# Altium footprint library LCLP.PcbLib: 75 footprints (part 4 of 5)
Each footprint in its own frame and in the unit in brackets; x right, y up, seen from the top. Pads: shape width x height; smd on the part's side, far side on the other; paste and mask are expansions set on the pad; w line width, h text height; cw(c..) or ccw(c..) is an arc to the next point about the centre after c.
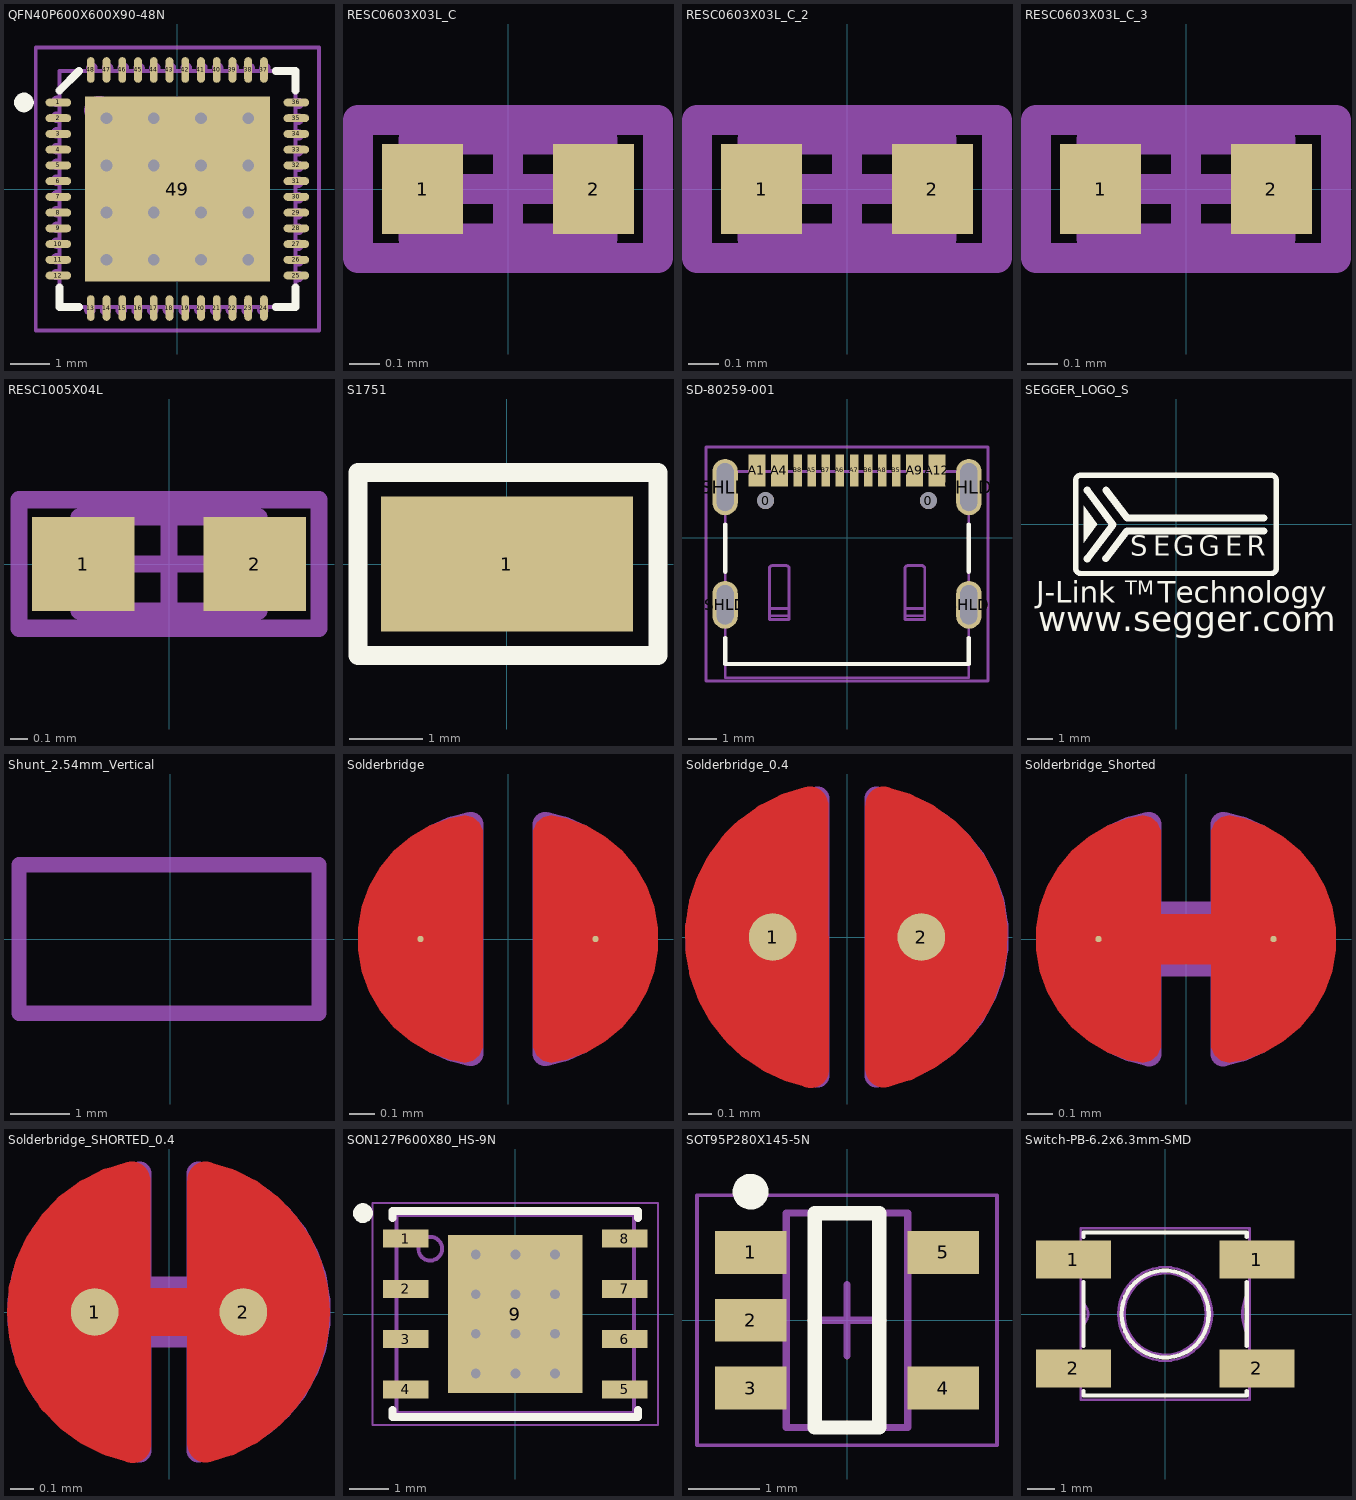
[diagram p3: the footprints below, top view; thin cyan lines are the x and y axes]

## QFN40P600X600X90-48N [mm] "QFN, 48-Leads, Body 6,0x6,0mm (max), Pitch 0,40mm, IPC Medium Density"
height 0.9
pads (49):
  oval 0.65x0.2 smd mask+0.05: 1(-3.025,2.2) 2(-3.025,1.8) 3(-3.025,1.4) 4(-3.025,1) 5(-3.025,0.6) 6(-3.025,0.2) 7(-3.025,-0.2) 8(-3.025,-0.6) 9(-3.025,-1) 10(-3.025,-1.4) 11(-3.025,-1.8) 12(-3.025,-2.2) 25(3.025,-2.2) 26(3.025,-1.8) 27(3.025,-1.4) 28(3.025,-1) 29(3.025,-0.6) 30(3.025,-0.2) 31(3.025,0.2) 32(3.025,0.6) 33(3.025,1) 34(3.025,1.4) 35(3.025,1.8) 36(3.025,2.2)
  oval 0.2x0.65 smd mask+0.05: 13(-2.2,-3.025) 14(-1.8,-3.025) 15(-1.4,-3.025) 16(-1,-3.025) 17(-0.6,-3.025) 18(-0.2,-3.025) 19(0.2,-3.025) 20(0.6,-3.025) 21(1,-3.025) 22(1.4,-3.025) 23(1.8,-3.025) 24(2.2,-3.025) 37(2.2,3.025) 38(1.8,3.025) 39(1.4,3.025) 40(1,3.025) 41(0.6,3.025) 42(0.2,3.025) 43(-0.2,3.025) 44(-0.6,3.025) 45(-1,3.025) 46(-1.4,3.025) 47(-1.8,3.025) 48(-2.2,3.025)
  rect 4.7x4.7 smd: 49(0,0)
via 1.8,-1.8 diameter 0.5 hole 0.3
via 0.6,-1.8 diameter 0.5 hole 0.3
via -0.6,-1.8 diameter 0.5 hole 0.3
via -1.8,-1.8 diameter 0.5 hole 0.3
via 1.8,-0.6 diameter 0.5 hole 0.3
via 0.6,-0.6 diameter 0.5 hole 0.3
via -0.6,-0.6 diameter 0.5 hole 0.3
via -1.8,-0.6 diameter 0.5 hole 0.3
via 1.8,0.6 diameter 0.5 hole 0.3
via 0.6,0.6 diameter 0.5 hole 0.3
via -0.6,0.6 diameter 0.5 hole 0.3
via -1.8,0.6 diameter 0.5 hole 0.3
via 1.8,1.8 diameter 0.5 hole 0.3
via 0.6,1.8 diameter 0.5 hole 0.3
via -0.6,1.8 diameter 0.5 hole 0.3
via -1.8,1.8 diameter 0.5 hole 0.3
Top Overlay:
  circle w0.25: c-3.9,2.2 r0.125
  lines w0.2: -3,-2.5 -3,-3 -2.5,-3 ; -3,2.5 -2.5,3 ; 2.5,-3 3,-3 3,-2.5 ; 2.5,3 3,3 3,2.5
Mechanical 7:
  circle w0.1: c-2,2 r0.32
  lines w0.1: -3,-2.269 -3.071,-2.269 cw(c-3.071,-2.174) -3.071,-2.079 -3,-2.079 ; -3,-1.869 -3.071,-1.869 cw(c-3.071,-1.774) -3.071,-1.679 -3,-1.679 ; -3,-1.469 -3.071,-1.469 cw(c-3.071,-1.374) -3.071,-1.279 -3,-1.279 ; -3,-1.069 -3.071,-1.069 cw(c-3.071,-0.974) -3.071,-0.879 -3,-0.879 ; -3,-0.669 -3.071,-0.669 cw(c-3.071,-0.574) -3.071,-0.479 -3,-0.479 ; -3,-0.269 -3.071,-0.269 cw(c-3.071,-0.174) -3.071,-0.079 -3,-0.079 ; -3,0.131 -3.071,0.131 cw(c-3.071,0.226) -3.071,0.321 -3,0.321 ; -3,0.531 -3.071,0.531 cw(c-3.071,0.626) -3.071,0.721 -3,0.721 ; -3,0.931 -3.071,0.931 cw(c-3.071,1.026) -3.071,1.121 -3,1.121 ; -3,1.331 -3.071,1.331 cw(c-3.071,1.426) -3.071,1.521 -3,1.521 ; -3,1.731 -3.071,1.731 cw(c-3.071,1.826) -3.071,1.921 -3,1.921 ; -3,2.131 -3.071,2.131 cw(c-3.071,2.226) -3.071,2.321 -3,2.321 ; -2.321,-3 -2.321,-3.071 ccw(c-2.226,-3.071) -2.131,-3.071 -2.131,-3 ; -2.269,3 -2.269,3.071 cw(c-2.174,3.071) -2.079,3.071 -2.079,3 ; -1.921,-3 -1.921,-3.071 ccw(c-1.826,-3.071) -1.731,-3.071 -1.731,-3 ; -1.869,3 -1.869,3.071 cw(c-1.774,3.071) -1.679,3.071 -1.679,3 ; -1.521,-3 -1.521,-3.071 ccw(c-1.426,-3.071) -1.331,-3.071 -1.331,-3 ; -1.469,3 -1.469,3.071 cw(c-1.374,3.071) -1.279,3.071 -1.279,3 ; -1.121,-3 -1.121,-3.071 ccw(c-1.026,-3.071) -0.931,-3.071 -0.931,-3 ; -1.069,3 -1.069,3.071 cw(c-0.974,3.071) -0.879,3.071 -0.879,3 ; -0.721,-3 -0.721,-3.071 ccw(c-0.626,-3.071) -0.531,-3.071 -0.531,-3 ; -0.669,3 -0.669,3.071 cw(c-0.574,3.071) -0.479,3.071 -0.479,3 ; -0.321,-3 -0.321,-3.071 ccw(c-0.226,-3.071) -0.131,-3.071 -0.131,-3 ; -0.269,3 -0.269,3.071 cw(c-0.174,3.071) -0.079,3.071 -0.079,3 ; 0.079,-3 0.079,-3.071 ccw(c0.174,-3.071) 0.269,-3.071 0.269,-3 ; 0.131,3 0.131,3.071 cw(c0.226,3.071) 0.321,3.071 0.321,3 ; 0.479,-3 0.479,-3.071 ccw(c0.574,-3.071) 0.669,-3.071 0.669,-3 ; 0.531,3 0.531,3.071 cw(c0.626,3.071) 0.721,3.071 0.721,3 ; 0.879,-3 0.879,-3.071 ccw(c0.974,-3.071) 1.069,-3.071 1.069,-3 ; 0.931,3 0.931,3.071 cw(c1.026,3.071) 1.121,3.071 1.121,3 ; 1.279,-3 1.279,-3.071 ccw(c1.374,-3.071) 1.469,-3.071 1.469,-3 ; 1.331,3 1.331,3.071 cw(c1.426,3.071) 1.521,3.071 1.521,3 ; 1.679,-3 1.679,-3.071 ccw(c1.774,-3.071) 1.869,-3.071 1.869,-3 ; 1.731,3 1.731,3.071 cw(c1.826,3.071) 1.921,3.071 1.921,3 ; 2.079,-3 2.079,-3.071 ccw(c2.174,-3.071) 2.269,-3.071 2.269,-3 ; 2.131,3 2.131,3.071 cw(c2.226,3.071) 2.321,3.071 2.321,3 ; 3,-2.321 3.071,-2.321 ccw(c3.071,-2.226) 3.071,-2.131 3,-2.131 ; 3,-1.921 3.071,-1.921 ccw(c3.071,-1.826) 3.071,-1.731 3,-1.731 ; 3,-1.521 3.071,-1.521 ccw(c3.071,-1.426) 3.071,-1.331 3,-1.331 ; 3,-1.121 3.071,-1.121 ccw(c3.071,-1.026) 3.071,-0.931 3,-0.931 ; 3,-0.721 3.071,-0.721 ccw(c3.071,-0.626) 3.071,-0.531 3,-0.531 ; 3,-0.321 3.071,-0.321 ccw(c3.071,-0.226) 3.071,-0.131 3,-0.131 ; 3,0.079 3.071,0.079 ccw(c3.071,0.174) 3.071,0.269 3,0.269 ; 3,0.479 3.071,0.479 ccw(c3.071,0.574) 3.071,0.669 3,0.669 ; 3,0.879 3.071,0.879 ccw(c3.071,0.974) 3.071,1.069 3,1.069 ; 3,1.279 3.071,1.279 ccw(c3.071,1.374) 3.071,1.469 3,1.469 ; 3,1.679 3.071,1.679 ccw(c3.071,1.774) 3.071,1.869 3,1.869 ; 3,2.079 3.071,2.079 ccw(c3.071,2.174) 3.071,2.269 3,2.269 ; -3,-3 3,-3 3,3 -3,3 -3,-3
  text ".Designator" at -0.079,-0.174 h0.31
Mechanical 15:
  lines w0.1: -0.5,0 0.5,0 ; 0,-0.5 0,0.5 ; -3.6,-3.6 3.6,-3.6 3.6,3.6 -3.6,3.6 -3.6,-3.6
3D body "User Library-QFN48.step": height 0.86, standoff -0.01, extent -3.02,-3.02 3.02,3.02

## RESC0603X03L_C [mm] "Chip Resistor, 2-Leads, Body 0.6x0.3mm, IPC High Density"
height 0.33
pads (2):
  rect 0.27x0.3 smd: 1(-0.285,0) 2(0.285,0)
Mechanical 7:
  lines w0.1: -0.315,-0.165 0.315,-0.165 0.315,0.165 -0.315,0.165 -0.315,-0.165
  text ".Designator" at 0.639,0.102 h0.31
Mechanical 15:
  lines w0.1: -0.165,0 0.165,0 ; 0,-0.165 0,0.165 ; -0.5,-0.23 0.5,-0.23 0.5,0.23 -0.5,0.23 -0.5,-0.23
3D body "User Library-res0201-1.step": height 0.23, standoff 0, extent -0.3,-0.15 0.3,0.15

## RESC0603X03L_C_2 [mm]
pads (2):
  rect 0.27x0.3 smd: 1(-0.285,0) 2(0.285,0)
Mechanical 7:
  lines w0.1: -0.315,-0.165 -0.315,0.165 0.315,0.165 0.315,-0.165 -0.315,-0.165
  text ".Designator" at -0.81,-0.113 h0.31
Mechanical 15:
  lines w0.1: -0.165,0 0.165,0 ; 0,-0.165 0,0.165 ; -0.5,-0.23 -0.5,0.23 0.5,0.23 0.5,-0.23 -0.5,-0.23
3D body "User Library-res0201-1.step": height 0.23, standoff 0, extent -0.3,-0.15 0.3,0.15

## RESC0603X03L_C_3 [mm]
pads (2):
  rect 0.27x0.3 smd: 1(-0.285,0) 2(0.285,0)
Mechanical 7:
  lines w0.1: -0.315,-0.165 -0.315,0.165 0.315,0.165 0.315,-0.165 -0.315,-0.165
  text ".Designator" at 1.525,0.552 h0.31
Mechanical 15:
  lines w0.1: -0.165,0 0.165,0 ; 0,-0.165 0,0.165 ; -0.5,-0.23 -0.5,0.23 0.5,0.23 0.5,-0.23 -0.5,-0.23
3D body "User Library-res0201-1.step": height 0.23, standoff 0, extent -0.3,-0.15 0.3,0.15

## RESC1005X04L [mm] "Chip Resistor, 2-Leads, Body 1.0x0.5mm, IPC High Density"
height 0.4
pads (2):
  rect 0.6x0.55 smd mask+0.05: 1(-0.5,0) 2(0.5,0)
Mechanical 7:
  lines w0.1: -0.525,-0.275 0.525,-0.275 0.525,0.275 -0.525,0.275 -0.525,-0.275
  text ".Designator" at -1.524,-0.102 h0.3
Mechanical 15:
  lines w0.1: -0.275,0 0.275,0 ; 0,-0.275 0,0.275 ; -0.875,-0.375 -0.875,0.375 0.875,0.375 0.875,-0.375 -0.875,-0.375
3D body "User Library-res0402-1.step": height 0.3, standoff 0, extent -0.5,-0.25 0.5,0.25

## S1751 [mm]
height 2
pads (1):
  rect 3.45x1.85 smd: 1(0,0)
Top Overlay:
  lines w0.254: -2.036,-1.25 2.064,-1.25 2.064,1.25 -2.036,1.25 -2.036,-1.25
Mechanical 7:
  lines w0.1: -1.625,-0.825 -1.625,0.825 1.625,0.825 1.625,-0.825 -1.625,-0.825
  text ".Designator" at 0.524,0.022 h0.31
3D body "s1751-46r.stp": height 2.05, standoff 0, extent -1.666,-0.799 1.584,0.851

## SD-80259-001 [mm] "USB TYPE C RECEPTACLE, 16 PIN"
height 1.5
pads (22):
  round 0.6 hole 0.6 unplated: 0(-2.89,1.315) 0(2.89,1.315)
  rect 0.6x1.14 smd: A1(-3.2,2.385) A4(-2.4,2.385) A9(2.4,2.385) A12(3.2,2.385)
  rect 0.3x1.14 smd: A5(-1.25,2.385) A6(-0.25,2.385) A7(0.25,2.385) A8(1.25,2.385) B5(1.75,2.385) B6(0.75,2.385) B7(-0.75,2.385) B8(-1.75,2.385)
  oval 0.9x1.7 hole 0.6 slot 1.4 at 90 deg: SHLD(-4.325,-2.385) SHLD(4.325,-2.385)
  oval 0.9x2 hole 0.6 slot 1.7 at 90 deg: SHLD(-4.325,1.795) SHLD(4.325,1.795)
  oval 0.9x1.7 on Top Paste: ""(-4.32,-2.385) ""(4.32,-2.385)
  oval 0.9x2 on Top Paste: ""(-4.32,1.795) ""(4.32,1.795)
Top Overlay:
  lines w0.152: -4.325,-3.563 -4.325,-4.485 4.325,-4.485 4.325,-3.563 ; -4.325,-1.207 -4.325,0.467 ; 4.325,-1.207 4.325,0.467
Mechanical 7:
  drawing of 1740 lines, arcs and shapes, not listed
  text ".Designator" at 0.15,-2.24 h0.31
Mechanical 15:
  lines w0.1: -4.325,-4.475 4.325,-4.475 ; -5,-5.085 0.71,-5.085 5,-5.085 5,3.215 -5,3.215 -5,-5.085
  text "Board Edge" at -2.02,-4.415 h0.38
3D body "CM-80259-1020_20191104.stp": height 3.26, standoff -1, extent -4.475,-4.98 4.475,2.74

## SEGGER_LOGO_S [mm] "Logo 7.82 mm x 3.84 mm, print overlay"
height 0.05
Top Overlay:
  region: -3.603,0.72 -3.603,-0.726 -3.061,-0.003
  lines w0.203: -3.912,-1.714 ccw(c-3.708,-1.714) -3.708,-1.918 3.708,-1.918 ccw(c3.708,-1.714) 3.912,-1.714 ; -3.912,-1.712 -3.912,1.697 ; -3.912,1.714 cw(c-3.708,1.714) -3.708,1.918 3.708,1.918 cw(c3.708,1.714) 3.912,1.714 ; 3.912,-1.712 3.912,1.697
  lines w0.279: -3.463,1.329 -2.459,-0.009 -3.457,-1.339 ; -2.742,-1.337 -1.909,-0.254 3.432,-0.254 ; -2.734,1.328 -1.909,0.254 3.432,0.254
  text "S" at -1.775,-1.496 h1.35
  text "E" at -0.886,-1.496 h1.35
  text "G" at -0.102,-1.496 h1.35
  text "G" at 0.889,-1.496 h1.35
  text "E" at 1.913,-1.496 h1.35
  text "R" at 2.748,-1.496 h1.35
  text "TM" at -1.989,-2.934 h0.94
  text "www.segger.com" at -5.377,-4.506 h1.68
  text "J-Link" at -5.458,-3.355 h1.45
  text "Technology" at -0.706,-3.355 h1.45

## Shunt_2.54mm_Vertical [mm]
height 6
Mechanical 7:
  lines w0.254: -2.538,-1.239 -2.538,1.25 2.491,1.25 2.491,-1.239 -2.538,-1.239
3D body "User Library-Control System_FCI_68786-102LF.STEP": height 9, standoff 3.92, extent -2.515,-1.245 2.515,1.245

## Solderbridge [mil]
pads (2):
  round 1 smd paste+0: 1(-13.78,0) 2(13.78,0)
Top Layer:
  region: 7.49,-19.36 9.17,-19.05 12.39,-17.86 15.35,-16.13 17.96,-13.92 20.16,-11.29 21.86,-8.31 23.03,-5.09 23.62,-1.71 23.62,0 23.62,1.71 23.03,5.09 21.86,8.31 20.16,11.29 17.96,13.92 15.35,16.13 12.39,17.86 9.17,19.05 7.49,19.36 6.83,19.48 5.53,19.14 4.51,18.29 3.94,17.07 3.94,16.4 3.94,-16.4 3.94,-17.07 4.51,-18.29 5.53,-19.14 6.83,-19.48
  region: -7.49,19.36 -9.17,19.05 -12.39,17.86 -15.35,16.13 -17.96,13.92 -20.16,11.29 -21.86,8.31 -23.03,5.09 -23.62,1.71 -23.62,0 -23.62,-1.71 -23.03,-5.09 -21.86,-8.31 -20.16,-11.29 -17.96,-13.92 -15.35,-16.13 -12.39,-17.86 -9.17,-19.05 -7.49,-19.36 -6.83,-19.48 -5.53,-19.14 -4.51,-18.29 -3.94,-17.07 -3.94,-16.4 -3.94,16.4 -3.94,17.07 -4.51,18.29 -5.53,19.14 -6.83,19.48
Top Solder:
  circle w24: c-3.94,0 r11.61
  circle w24: c3.94,0 r11.61
  rectangle: -3.93,-23.62 3.94,23.62
Mechanical 7:
  lines w3.94: -5.84,-18.07 cw(c-2.65,0) -5.84,18.07 -5.84,-18.07 ; 5.84,-18.07 ccw(c2.65,0) 5.84,18.07 5.84,-18.07
  text ".Designator" at -108.77,-5.25 h12.01

## Solderbridge_0.4 [mm]
pads (2):
  round 0.2 smd paste-10: 1(-0.312,0) 2(0.312,0)
Top Layer:
  region: 0.077,0.553 0.203,0.512 0.335,0.424 0.409,0.351 0.462,0.292 0.521,0.193 0.549,0.099 0.544,-0.122 0.518,-0.193 0.434,-0.33 0.351,-0.411 0.152,-0.536 0.077,-0.559
  region: -0.077,-0.553 -0.129,-0.605 -0.205,-0.554 -0.409,-0.351 -0.462,-0.292 -0.521,-0.193 -0.549,-0.099 -0.544,0.122 -0.518,0.193 -0.434,0.33 -0.351,0.411 -0.259,0.469 -0.159,0.556 -0.08,0.565
  lines w0.152: -0.156,0.557 ccw(c-0.035,0) -0.408,0.431 ccw(c-0.035,0) -0.442,0.399 ccw(c-0.035,0) -0.466,0.373 ccw(c-0.035,0) -0.312,-0.498 ccw(c-0.035,0) -0.153,-0.558 ; 0.153,-0.557 ccw(c0.03,0) 0.527,-0.279 ccw(c0.03,0) 0.538,-0.259 ccw(c0.03,0) 0.549,-0.237 ccw(c0.03,0) 0.153,0.557
Top Solder:
  circle w0.61: c-0.003,0 r0.4
  circle w0.61: c-0.003,0 r0.2
Mechanical 7:
  lines w0.1: -0.124,-0.582 cw(c-0.042,0) -0.124,0.582 ; -0.123,-0.582 -0.123,0.582 ; 0.123,-0.582 0.123,0.582 ; 0.124,-0.582 ccw(c0.042,0) 0.124,0.582
  text ".Designator" at 0.094,-0.374 h0.31

## Solderbridge_Shorted [mil]
height 19.68
pads (2):
  round 1 smd paste+0: 1(-13.78,0) 2(13.78,0)
Top Layer:
  region: -4.92,3.94 -4.92,-3.94 4.92,-3.94 4.92,3.94
  region: 7.49,-19.36 9.17,-19.05 12.39,-17.86 15.35,-16.13 17.96,-13.92 20.16,-11.29 21.86,-8.31 23.03,-5.09 23.62,-1.71 23.62,0 23.62,1.71 23.03,5.09 21.86,8.31 20.16,11.29 17.96,13.92 15.35,16.13 12.39,17.86 9.17,19.05 7.49,19.36 6.83,19.48 5.53,19.14 4.51,18.29 3.94,17.07 3.94,16.4 3.94,-16.4 3.94,-17.07 4.51,-18.29 5.53,-19.14 6.83,-19.48
  region: -7.49,19.36 -9.17,19.05 -12.39,17.86 -15.35,16.13 -17.96,13.92 -20.16,11.29 -21.86,8.31 -23.03,5.09 -23.62,1.71 -23.62,0 -23.62,-1.71 -23.03,-5.09 -21.86,-8.31 -20.16,-11.29 -17.96,-13.92 -15.35,-16.13 -12.39,-17.86 -9.17,-19.05 -7.49,-19.36 -6.83,-19.48 -5.53,-19.14 -4.51,-18.29 -3.94,-17.07 -3.94,-16.4 -3.94,16.4 -3.94,17.07 -4.51,18.29 -5.53,19.14 -6.83,19.48
Top Solder:
  circle w24: c3.94,0 r11.61
  circle w24: c-3.94,0 r11.61
  rectangle: -3.94,-23.62 3.94,23.63
Mechanical 7:
  lines w3.94: -5.84,-18.07 cw(c-2.65,0) -5.84,18.07 -5.84,3.94 5.84,3.94 5.84,18.07 cw(c2.65,0) 5.84,-18.07 5.84,-3.94 -5.84,-3.94 -5.84,-18.07
  text ".Designator" at 4.59,-12.74 h12

## Solderbridge_SHORTED_0.4 [mm]
pads (2):
  round 0.2 smd paste-10: 1(-0.312,0) 2(0.312,0)
Top Layer:
  region: 0.077,0.553 0.203,0.512 0.335,0.424 0.409,0.351 0.462,0.292 0.521,0.193 0.549,0.099 0.544,-0.122 0.518,-0.193 0.434,-0.33 0.351,-0.411 0.152,-0.536 0.077,-0.559
  region: -0.077,-0.553 -0.129,-0.605 -0.205,-0.554 -0.409,-0.351 -0.462,-0.292 -0.521,-0.193 -0.549,-0.099 -0.544,0.122 -0.518,0.193 -0.434,0.33 -0.351,0.411 -0.259,0.469 -0.159,0.556 -0.08,0.565
  lines w0.152: -0.156,0.557 ccw(c-0.035,0) -0.153,-0.558 ; 0.153,-0.557 ccw(c0.03,0) 0.153,0.557
  lines w0.203: -0.312,0 0.363,0
Top Solder:
  circle w0.61: c-0.003,0 r0.4
  circle w0.61: c-0.003,0 r0.2
Mechanical 7:
  lines w0.1: -0.124,-0.582 cw(c-0.042,0) -0.124,0.582 ; -0.123,-0.582 -0.123,-0.1 0.125,-0.1 ; -0.123,0.582 -0.123,0.1 0.123,0.1 0.123,0.582 ; 0.123,-0.582 0.123,-0.1 ; 0.124,-0.582 ccw(c0.042,0) 0.124,0.582
  text ".Designator" at 1.525,0.994 h0.31

## SON127P600X80_HS-9N [mm] "SON, 8-Leads, Body 5.00x6.00mm, Pitch 1.27mm, Thermal Pad 4.00x3.40mm, IPC Medium Density"
height 0.8
pads (9):
  rect 1.15x0.45 smd: 1(-2.77,1.905) 2(-2.77,0.635) 3(-2.77,-0.635) 4(-2.77,-1.905) 5(2.77,-1.905) 6(2.77,-0.635) 7(2.77,0.635) 8(2.77,1.905)
  rect 3.4x4 smd paste-1.7: 9(0,0)
via 1,-1.5 diameter 0.5 hole 0.25
via 0,-1.5 diameter 0.5 hole 0.25
via -1,-1.5 diameter 0.5 hole 0.25
via 1,-0.5 diameter 0.5 hole 0.25
via 0,-0.5 diameter 0.5 hole 0.25
via -1,-0.5 diameter 0.5 hole 0.25
via 1,0.5 diameter 0.5 hole 0.25
via 0,0.5 diameter 0.5 hole 0.25
via -1,0.5 diameter 0.5 hole 0.25
via 1,1.5 diameter 0.5 hole 0.25
via 0,1.5 diameter 0.5 hole 0.25
via -1,1.5 diameter 0.5 hole 0.25
Top Overlay:
  circle w0.25: c-3.85,2.55 r0.125
  lines w0.2: -3.1,-2.43 -3.1,-2.6 3.1,-2.6 3.1,-2.43 ; -3.1,2.43 -3.1,2.6 3.1,2.6 3.1,2.43
Top Paste:
  rectangle: 0.665,-1.895 1.595,-0.765
  rectangle: 0.665,-0.565 1.595,0.565
  rectangle: 0.665,0.765 1.595,1.895
  rectangle: -0.465,-1.895 0.465,-0.765
  rectangle: -0.465,-0.565 0.465,0.565
  rectangle: -0.465,0.765 0.465,1.895
  rectangle: -1.595,-1.895 -0.665,-0.765
  rectangle: -1.595,-0.565 -0.665,0.565
  rectangle: -1.595,0.765 -0.665,1.895
Mechanical 7:
  circle w0.1: c-2.15,1.65 r0.3
  lines w0.1: -3,-2.5 3,-2.5 3,2.5 -3,2.5 -3,-2.5
  text ".Designator" at 1.525,0.102 h0.31
Mechanical 15:
  lines w0.05: -3.605,-2.8 3.605,-2.8 3.605,2.8 -3.605,2.8 -3.605,-2.8
  lines w0.1: -0.5,0 0.5,0 ; 0,-0.5 0,0.5
3D body "SON127P600X80_HS-9N.step": height 0.8, standoff 0, extent -3.051,-2.55 3.051,2.55

## SOT95P280X145-5N [mm] "SOT23, 5-Leads, Body 2,90x2,80mm, Pitch 0,95mm, IPC Medium Density"
height 1.45
pads (5):
  rect 1x0.6 smd: 1(-1.35,0.95) 2(-1.35,0) 3(-1.35,-0.95) 4(1.35,-0.95) 5(1.35,0.95)
Top Overlay:
  circle w0.25: c-1.35,1.8 r0.125
  lines w0.2: -0.45,-1.5 0.45,-1.5 0.45,1.5 -0.45,1.5 -0.45,-1.5
Mechanical 7:
  lines w0.1: -0.85,-1.5 0.85,-1.5 0.85,1.5 -0.85,1.5 -0.85,-1.5
  text ".Designator" at -0.25,0.5 h0.38
Mechanical 15:
  lines w0.05: -2.1,-1.75 2.1,-1.75 2.1,1.75 -2.1,1.75 -2.1,-1.75
  lines w0.1: -0.5,0 0.5,0 ; 0,-0.5 0,0.5
3D body "SOT95P275X145-5N.step": height 1.45, standoff 0, extent -1.5,-1.55 1.5,1.55

## Switch-PB-6.2x6.3mm-SMD [mm] "6.2×6.5mm TACT Switch, without ground connector"
height 2.5
pads (4):
  rect 2.75x1.4 smd: 1(-3.375,2) 1(3.375,2) 2(-3.375,-2) 2(3.375,-2)
Top Overlay:
  circle w0.152: c0,0 r1.601
  lines w0.152: -3,-2.826 -3,-3 3,-3 3,-2.826 ; -3,-1.174 -3,1.174 ; -3,2.826 -3,3 3,3 3,2.826 ; 3,-1.174 3,1.174
Mechanical 7:
  circle w0.1: c0,0 r1.721
  circle w0.1: c0,0 r1.5
  lines w0.1: -3.3,-2.393 -3.3,-1.606 ; -3.3,1.606 -3.3,2.393 ; -3.1,-2.393 -3.6,-2.393 -3.6,-1.606 -3.1,-1.606 ; -3.1,-0.441 ccw(c-3.335,0) -3.1,0.441 ; -3.1,1.606 -3.6,1.606 -3.6,2.393 -3.1,2.393 ; 3.1,-2.393 3.6,-2.393 3.6,-1.606 3.1,-1.606 ; 3.1,-0.91 cw(c4.561,0) 3.1,0.91 ; 3.1,1.606 3.6,1.606 3.6,2.393 3.1,2.393 ; 3.3,-2.393 3.3,-1.606 ; 3.3,1.606 3.3,2.393 ; -3.1,-3.15 -3.1,3.15 3.1,3.15 3.1,-3.15 -3.1,-3.15
  text ".Designator" at 1.525,0.102 h0.31
3D body "TS604VM1-025BR-R.step": height 2.5, standoff 0, extent -3.6,-3.1 3.6,3.1